# Altium footprint library FMU3_REV_D.PcbLib: 53 footprints (part 2 of 4)
Each footprint in its own frame and in the unit in brackets; x right, y up, seen from the top. Pads: shape width x height; smd on the part's side, far side on the other; paste and mask are expansions set on the pad; w line width, h text height; cw(c..) or ccw(c..) is an arc to the next point about the centre after c.
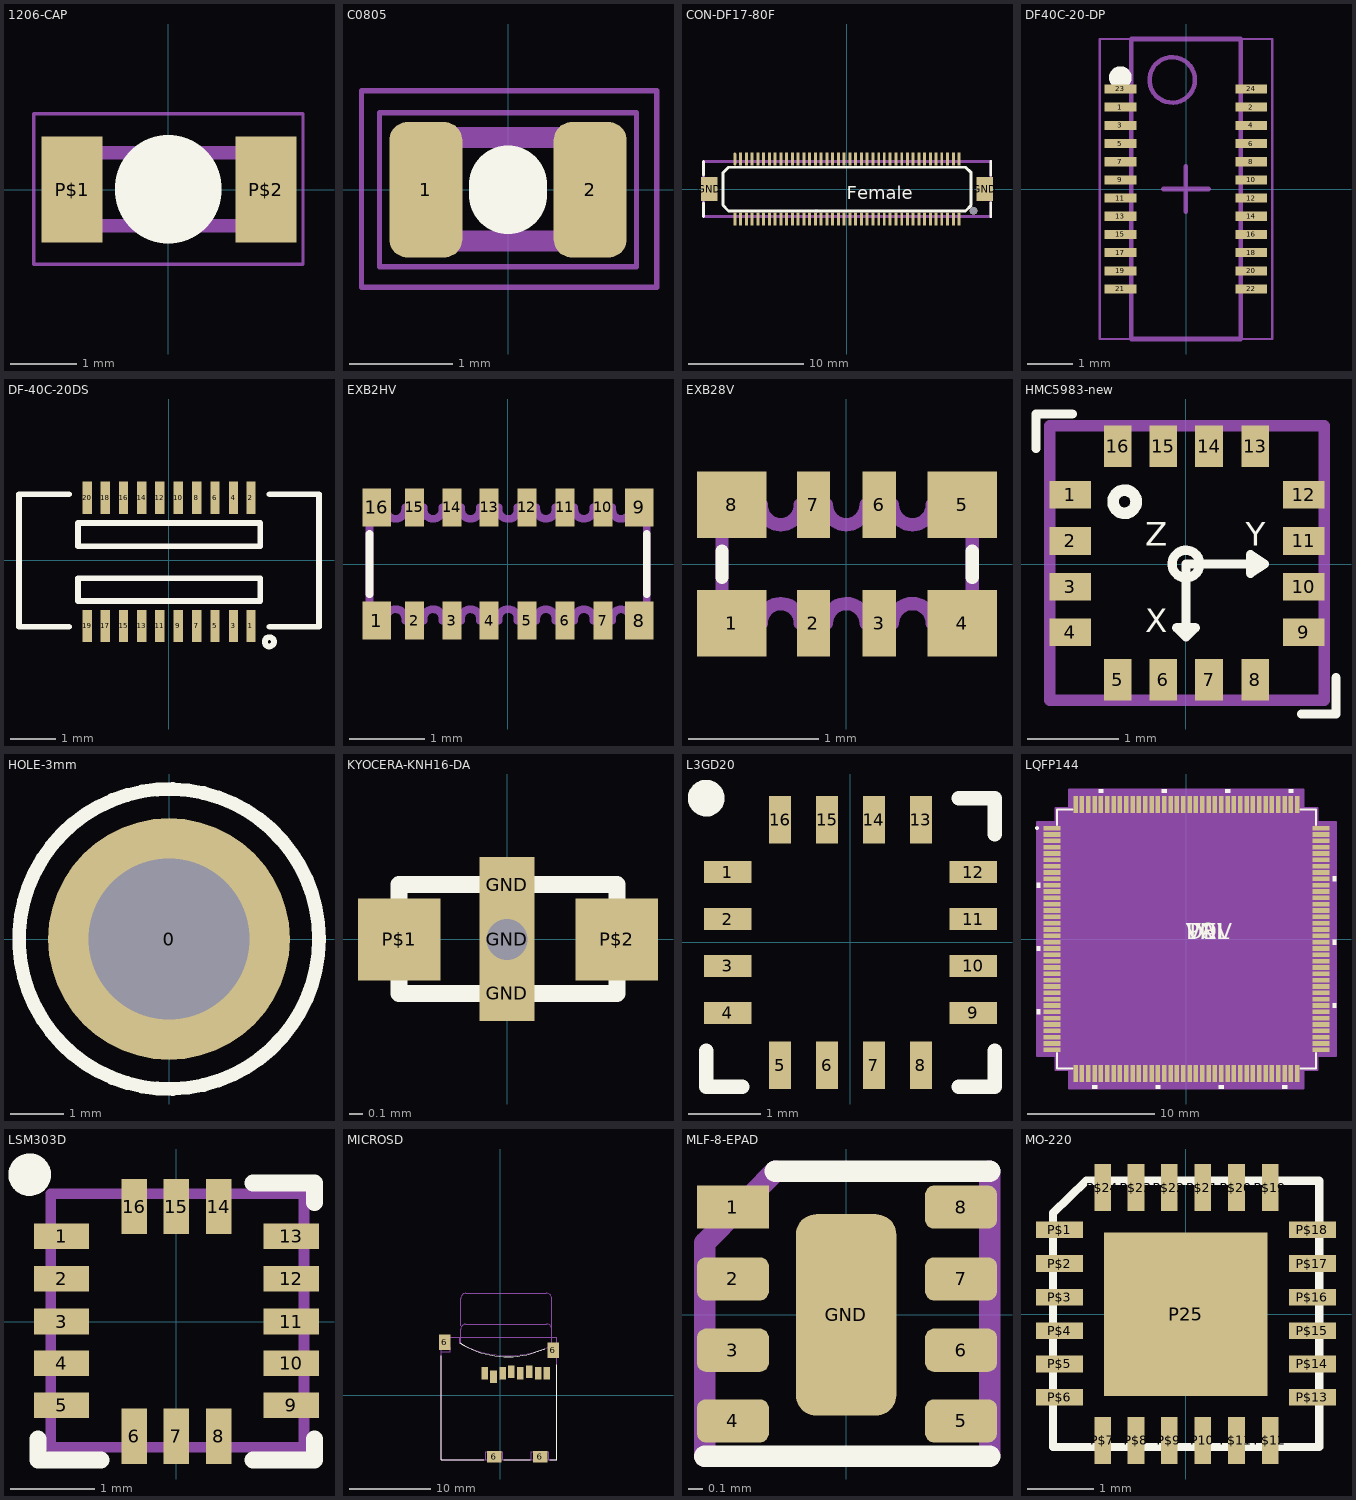
[diagram p1: the footprints below, top view; thin cyan lines are the x and y axes]

## 1206-CAP [mil]
pads (2):
  rect 36x63 smd: P$1(-57.09,0) P$2(58,0)
Top Overlay:
  lines w63: 0,-0.39 0,1
Mechanical 16:
  rectangle: -68.9,-25.59 -45.27,26
  rectangle: 46,-25.59 69,26
  lines w2: -79.72,-44.29 80,-44.29 80,45 -79.72,45 -79.72,-44.29
  lines w8: -45.28,-21.59 46,-21.59 ; -45.28,22 46,22

## C0805 [mil]
height 66.93
pads (2):
  rrect50% 28x52 smd mask+0: 1(-31.5,0) 2(31.5,0)
Top Overlay:
  lines w30: 0,-2 0,2
Mechanical 2:
  lines w1.97: -49.21,-29.53 -49.21,29.53 49.21,29.53 49.21,-29.53 -49.21,-29.53
Mechanical 3:
Mechanical 16:
  rectangle: 23.99,-23.67 39.99,24
  rectangle: -39.37,-23.67 -23.62,24
  lines w2: -56.1,-37.4 -56.1,38 57,38 57,-37.4 -56.1,-37.4
  lines w8: -23.62,-19.68 24,-19.68 ; -23.62,20 24,20
3D body: height 30.79, standoff 0, extent -39.37,-24.61 39.37,24.61

## CON-DF17-80F [mil]
pads (83):
  rrect100% 10x44 smd: 1(-383.86,103)
  rect 10x44 smd: 2(-383.86,-102.36) 3(-364.17,103) 4(-364.17,-102.36) 5(-344.49,103) 6(-344.49,-102.36) 7(-324.8,103) 8(-324.8,-102.36) 9(-305.12,103) 10(-305.12,-102.36) 11(-285.43,103) 12(-285.43,-102.36) 13(-265.75,103) 14(-265.75,-102.36) 15(-246.06,103) 16(-246.06,-102.36) 17(-226.38,103) 18(-226.38,-102.36) 19(-206.69,103) 20(-206.69,-102.36) 21(-187.01,103) 22(-187.01,-102.36) 23(-167.32,103) 24(-167.32,-102.36) 25(-147.64,103) 26(-147.64,-102.36) 27(-127.95,103) 28(-127.95,-102.36) 29(-108.27,103) 30(-108.27,-102.36) 31(-88.58,103) 32(-88.58,-102.36) 33(-68.9,103) 34(-68.9,-102.36) 35(-49.21,103) 36(-49.21,-102.36) 37(-29.53,103) 38(-29.53,-102.36) 39(-9.84,103) 40(-9.84,-102.36) 41(10,103) 42(10,-102.36) 43(30,103) 44(30,-102.36) 45(50,103) 46(50,-102.36) 47(69,103) 48(69,-102.36) 49(89,103) 50(89,-102.36) 51(109,103) 52(109,-102.36) 53(128,103) 54(128,-102.36) 55(148,103) 56(148,-102.36) 57(168,103) 58(168,-102.36) 59(188,103) 60(188,-102.36) 61(207,103) 62(207,-102.36) 63(227,103) 64(227,-102.36) 65(247,103) 66(247,-102.36) 67(266,103) 68(266,-102.36) 69(286,103) 70(286,-102.36) 71(306,103) 72(306,-102.36) 73(325,103) 74(325,-102.36) 75(345,103) 76(345,-102.36) 77(365,103) 78(365,-102.36) 79(384,103) 80(384,-102.36)
  rect 56x83 smd: GND(-472.44,0) GND(473,0)
  round 25.98 hole 26 unplated: hole-2(434,-74.8)
Top Overlay:
  lines w10: -492.13,-94.49 -492.13,-47.24 ; -492.13,48 -492.13,95 ; 493,-94.49 493,-47.24 ; 493,48 493,95 ; -425.2,-55.12 -425.2,56 -405.51,75 406,75 426,56 426,-55.12 406,-74.8 -405.51,-74.8 -425.2,-55.12
  text "Female" at 0,-50 h77.5
Mechanical 16:
  lines w10: -106.3,-74.8 -102.36,-74.8 ; -492.13,-94.49 493,-94.49 493,95 -492.13,95 -492.13,-94.49
3D body: height 118.11, standoff -23.62, extent -491.85,-112.2 492.4,112.21

## DF40C-20-DP [mm]
height 2
pads (24):
  rect 0.7x0.2 smd mask+0: 1(-1.444,1.8) 2(1.436,1.8) 3(-1.444,1.4) 4(1.436,1.4) 5(-1.444,1) 6(1.436,1) 7(-1.444,0.6) 8(1.436,0.6) 9(-1.444,0.2) 10(1.436,0.2) 11(-1.444,-0.2) 12(1.436,-0.2) 13(-1.444,-0.6) 14(1.436,-0.6) 15(-1.444,-1) 16(1.436,-1) 17(-1.444,-1.4) 18(1.436,-1.4) 19(-1.444,-1.8) 20(1.436,-1.8) 21(-1.444,-2.2) 22(1.436,-2.2) 23(-1.444,2.2) 24(1.436,2.2)
Top Overlay:
  circle w0.25: c-1.444,2.45 r0.125
Mechanical 13:
  circle w0.1: c-0.304,2.4 r0.5
  lines w0.1: -1.2,3.3 -1.2,3.3 ; -1.2,3.3 1.2,3.3 ; -1.2,3.3 -1.2,-3.3 1.2,-3.3 1.2,3.3 ; 1.2,3.3 1.2,3.3
Mechanical 15:
  lines w0.05: -1.9,-3.3 1.9,-3.3 1.9,3.3 -1.9,3.3 -1.9,-3.3
  lines w0.1: -0.504,0 0.496,0 ; -0.004,-0.5 -0.004,0.5
3D body: height 1.09, standoff -0.05, extent -1.47,-2.76 1.5,2.76

## DF-40C-20DS [mil] "DF-40C-20DS"
pads (20):
  rect 8x28 smd: 1(71,-57.09) 2(71,54) 3(56,-57.09) 4(56,54) 5(40,-57.09) 6(40,54) 7(24,-57.09) 8(24,54) 9(8,-57.09) 10(8,54) 11(-7.87,-57.09) 12(-7.87,54) 13(-23.62,-57.09) 14(-23.62,54) 15(-39.37,-57.09) 16(-39.37,54) 17(-55.12,-57.09) 18(-55.12,54) 19(-70.87,-57.09) 20(-70.87,54)
Top Overlay:
  circle w5: c87,-70.87 r4
  lines w5: -86.61,-57.87 -129.92,-57.87 -129.92,57 -86.61,57 ; 87,-57.87 130,-57.87 130,57 87,57 ; -78.74,-35.43 -78.74,-15.75 79,-15.75 79,-35.43 -78.74,-35.43 ; -78.74,12 79,12 79,32 -78.74,32 -78.74,12
3D body: height 55.12, standoff -1.97, extent -129.92,-68.07 129.92,65

## EXB2HV [mil] "EXB2HV"
pads (16):
  rect 15x20 smd: 1(-68.9,-29.53) 8(69,-29.53) 9(69,30) 16(-68.9,30)
  rect 10x20 smd: 2(-49.21,-29.53) 3(-29.53,-29.53) 4(-9.84,-29.53) 5(10,-29.53) 6(30,-29.53) 7(50,-29.53) 10(50,30) 11(30,30) 12(10,30) 13(-9.84,30) 14(-29.53,30) 15(-49.21,30)
Top Overlay:
  lines w4: -72.83,-15.75 -72.83,16 ; 73,-15.75 73,16
Mechanical 16:
  lines w4: -72.83,-29.53 -72.83,30 -63.98,30 -63.98,29 ccw(c-59.11,28.86) -59.25,24 -58.86,24 ccw(c-59,28.86) -54.13,29 -54.13,30 -44.29,30 -44.29,29 ccw(c-39.43,28.86) -39.57,24 -39.17,24 ccw(c-39.31,28.86) -34.45,29 -34.45,30 -24.61,30 -24.61,29 ccw(c-19.74,28.86) -19.88,24 -19.49,24 ccw(c-19.63,28.86) -14.76,29 -14.76,30 -4.92,30 -4.92,29 ccw(c-0.06,28.86) -0.2,24 1,24 ccw(c0.5,28.5) 5,29 5,30 15,30 15,29 ccw(c20,29) 20,24 ccw(c20,29) 25,29 25,30 35,30 35,29 ccw(c40,29) 40,24 ccw(c40,29) 45,29 45,30 55,30 55,29 ccw(c59.5,28.5) 59,24 60,24 ccw(c59.5,28.5) 64,29 64,30 73,30 73,-29.53 64,-29.53 64,-28.35 ccw(c59.64,-27.98) 60,-23.62 59,-23.62 ccw(c59.36,-27.98) 55,-28.35 55,-29.53 45,-29.53 45,-28.35 ccw(c40.14,-28.48) 40,-23.62 ccw(c39.86,-28.48) 35,-28.35 35,-29.53 25,-29.53 25,-28.35 ccw(c20.14,-28.48) 20,-23.62 ccw(c19.86,-28.48) 15,-28.35 15,-29.53 5,-29.53 5,-28.35 ccw(c0.64,-27.98) 1,-23.62 -0.2,-23.62 ccw(c-0.2,-28.35) -4.92,-28.35 -4.92,-29.53 -14.76,-29.53 -14.76,-28.35 ccw(c-19.49,-28.35) -19.49,-23.62 -19.88,-23.62 ccw(c-19.88,-28.35) -24.61,-28.35 -24.61,-29.53 -34.45,-29.53 -34.45,-28.35 ccw(c-39.17,-28.35) -39.17,-23.62 -39.57,-23.62 ccw(c-39.57,-28.35) -44.29,-28.35 -44.29,-29.53 -54.13,-29.53 -54.13,-28.35 ccw(c-58.86,-28.35) -58.86,-23.62 -59.25,-23.62 ccw(c-59.25,-28.35) -63.98,-28.35 -63.98,-29.53 -72.83,-29.53
3D body: height 19.84, standoff -0.16, extent -60.1,-20 -40,20
3D body: height 19.84, standoff -0.16, extent 59.95,-20 80.05,20
3D body: height 19.84, standoff -0.16, extent 39.9,-20 60,20
3D body: height 19.84, standoff -0.16, extent 19.9,-20 40,20
3D body: height 19.84, standoff -0.16, extent -0.1,-20 20,20
3D body: height 19.84, standoff -0.16, extent -20.1,-20 0,20
3D body: height 19.84, standoff -0.16, extent -40.1,-20 -20,20
3D body: height 19.84, standoff -0.16, extent -80.1,-20 -60,20

## EXB28V [mil] "EXB28V"
pads (8):
  rect 21x20 smd: 1(-34.45,-17.72) 4(35,-17.72) 5(35,18) 8(-34.45,18)
  rect 10x20 smd: 2(-9.84,-17.72) 3(10,-17.72) 6(10,18) 7(-9.84,18)
Top Overlay:
  lines w4: -37.4,-3.94 -37.4,4 ; 38,-3.94 38,4
Mechanical 16:
  lines w4: -37.4,-17.72 -37.4,18 -25.59,18 ccw(c-19.64,17.95) -19.69,12 ccw(c-19.73,17.95) -13.78,18 -5.91,18 ccw(c0.05,17.95) 0,12 ccw(c0,18) 6,18 14,18 ccw(c20,18) 20,12 ccw(c20,18) 26,18 38,18 38,-17.72 26,-17.72 ccw(c20.05,-17.76) 20,-11.81 ccw(c19.95,-17.76) 14,-17.72 6,-17.72 ccw(c0.05,-17.76) 0,-11.81 ccw(c0,-17.72) -5.91,-17.72 -13.78,-17.72 ccw(c-19.68,-17.72) -19.68,-11.81 ccw(c-19.68,-17.72) -25.59,-17.72 -37.4,-17.72
3D body: height 20.1, standoff 0, extent -40,-20 -20,20
3D body: height 20.1, standoff 0, extent -20,-20 0,20
3D body: height 20.1, standoff 0, extent 20,-20 40,20
3D body: height 20.1, standoff 0, extent 0,-20 20,20

## HMC5983-new [mil] "HMC5983"
pads (16):
  rect 18x12 smd: 1(-50.2,30) 2(-50.2,10) 3(-50.2,-9.84) 4(-50.2,-29.53) 9(51,-29.53) 10(51,-9.84) 11(51,10) 12(51,30)
  rect 12x18 smd: 5(-29.53,-50.2) 6(-9.84,-50.2) 7(10,-50.2) 8(30,-50.2) 13(30,51) 14(10,51) 15(-9.84,51) 16(-29.53,51)
Top Overlay:
  circle w5: c-26.57,27 r5
  circle w4: c0,0 r6
  lines w4: -64.96,50 -64.96,65 -49.21,65 ; 50,-64.96 65,-64.96 65,-49.21 ; 0,-31.5 0,0 34,0 ; 0,-31.5 4,-27.56 -3.94,-27.56 0,-31.5 ; 34,0 28,4 28,-3.94 34,0
  text "X" at -17.72,-29.53 h10.2
  text "Y" at 26,8 h10.2
  text "Z" at -17.72,8 h10.2
Mechanical 16:
  lines w5: -59.06,-59.06 60,-59.06 ; -59.06,-59.06 -59.06,60 ; -59.06,-59.06 60,-59.06 ; -59.06,-59.06 -59.06,60 ; -59.06,60 60,60 ; -59.06,60 60,60 ; 60,-59.06 60,60 ; 60,-59.06 60,60
3D body: height 35.43, standoff 0, extent -59,-58.88 60.77,60.88

## HOLE-3mm [mm] "Surface mount thread"
height 2
pads (1):
  round 4.5 hole 3: 0(0,0)
Top Overlay:
  circle w0.254: c0,0 r2.794
Top Paste:
  lines w1: -1.414,-0.707 ccw(c0,0) -0.707,-1.414 ; -1.414,0.707 cw(c0,0) -0.707,1.414 ; 0.707,-1.414 ccw(c0,0) 1.414,-0.707 ; 0.707,1.414 cw(c0,0) 1.414,0.707
Top Solder:
  lines w1: -1.414,-0.707 ccw(c0,0) -0.707,-1.414 ; -1.414,0.707 cw(c0,0) -0.707,1.414 ; 0.707,-1.414 ccw(c0,0) 1.414,-0.707 ; 0.707,1.414 cw(c0,0) 1.414,0.707
3D body: height 2, standoff -0.48, extent -1.651,-1.83 1.529,1.83

## KYOCERA-KNH16-DA [mil] "KYOCERA-KNH16-DA"
pads (5):
  rect 16x16 smd: GND(0,-15.75) GND(0,16)
  rect 16x16 hole 12: GND(0,0)
  rect 24x24 smd: P$1(-31.5,0) P$2(32,0)
Top Overlay:
  lines w5: -31.5,-15.75 32,-15.75 32,16 -31.5,16 -31.5,-15.75
3D body: height 13.78, standoff 0, extent -19.69,-9.84 19.69,9.84

## L3GD20 [mil] "4x4x1"
pads (16):
  rect 26x12 smd mask+0: 1(-66.93,38.39) 2(-66.93,12.8) 3(-66.93,-12.8) 4(-66.93,-38.39) 9(66.93,-38.39) 10(66.93,-12.8) 11(66.93,12.8) 12(66.93,38.39)
  rect 12x26 smd mask+0: 5(-38.39,-66.93) 6(-12.8,-66.93) 7(12.8,-66.93) 8(38.39,-66.93) 13(38.39,66.93) 14(12.8,66.93) 15(-12.8,66.93) 16(-38.39,66.93)
Top Overlay:
  circle w10: c-78.74,78.74 r5
  lines w8: -78.74,-59.06 -78.74,-78.74 -59.06,-78.74 ; 59.06,-78.74 78.74,-78.74 78.74,-59.06 ; 59.06,78.74 78.74,78.74 78.74,59.06
3D body: height 38.78, standoff 0, extent -78.74,-78.74 78.74,78.74

## LQFP144 [mil] "check VDD&VSS pins"
pads (144):
  rect 53x14 smd: 1(-418.31,344.49) 2(-418.31,324.8) 3(-418.31,305.12) 4(-418.31,285.43) 5(-418.31,265.75) 6(-418.31,246.06) 7(-418.31,226.38) 8(-418.31,206.69) 9(-418.31,187.01) 10(-418.31,167.32) 11(-418.31,147.64) 12(-418.31,127.95) 13(-418.31,108.27) 14(-418.31,88.58) 15(-418.31,68.9) 18(-418.31,9.84) 19(-418.31,-9.84) 20(-418.31,-29.53) 21(-418.31,-49.21) 22(-418.31,-68.9) 23(-418.31,-88.58) 24(-418.31,-108.27) 25(-418.31,-127.95) 26(-418.31,-147.64) 27(-418.31,-167.32) 28(-418.31,-187.01) 29(-418.31,-206.69) 31(-418.31,-246.06) 32(-418.31,-265.75) 33(-418.31,-285.43) 34(-418.31,-305.12) 35(-418.31,-324.8) 36(-418.31,-344.49) 73(418.31,-344.49) 74(418.31,-324.8) 75(418.31,-305.12) 76(418.31,-285.43) 77(418.31,-265.75) 78(418.31,-246.06) 79(418.31,-226.38) 80(418.31,-206.69) 81(418.31,-187.01) 82(418.31,-167.32) 85(418.31,-108.27) 86(418.31,-88.58) 87(418.31,-68.9) 88(418.31,-49.21) 89(418.31,-29.53) 90(418.31,-9.84) 91(418.31,9.84) 92(418.31,29.53) 93(418.31,49.21) 96(418.31,108.27) 97(418.31,127.95) 98(418.31,147.64) 99(418.31,167.32) 100(418.31,187.01) 101(418.31,206.69) 102(418.31,226.38) 103(418.31,246.06) 104(418.31,265.75) 105(418.31,285.43) 106(418.31,305.12) VDD(-418.31,-226.38) VDD(-418.31,29.53) VDD(418.31,-127.95) VDD(418.31,88.58) VDD(418.31,344.49) VSS(-418.31,49.21) VSS(418.31,-147.64) VSS(418.31,68.9) VSS(418.31,324.8)
  rect 14x53 smd: 37(-344.49,-418.31) 40(-285.43,-418.31) 41(-265.75,-418.31) 42(-246.06,-418.31) 43(-226.38,-418.31) 44(-206.69,-418.31) 45(-187.01,-418.31) 46(-167.32,-418.31) 47(-147.64,-418.31) 48(-127.95,-418.31) 49(-108.27,-418.31) 50(-88.58,-418.31) 53(-29.53,-418.31) 54(-9.84,-418.31) 55(9.84,-418.31) 56(29.53,-418.31) 57(49.21,-418.31) 58(68.9,-418.31) 59(88.58,-418.31) 60(108.27,-418.31) 63(167.32,-418.31) 64(187.01,-418.31) 65(206.69,-418.31) 66(226.38,-418.31) 67(246.06,-418.31) 68(265.75,-418.31) 69(285.43,-418.31) 70(305.12,-418.31) 71(324.8,-418.31) 109(344.49,418.31) 110(324.8,418.31) 111(305.12,418.31) 112(285.43,418.31) 113(265.75,418.31) 114(246.06,418.31) 115(226.38,418.31) 116(206.69,418.31) 117(187.01,418.31) 118(167.32,418.31) 119(147.64,418.31) 122(88.58,418.31) 123(68.9,418.31) 124(49.21,418.31) 125(29.53,418.31) 126(9.84,418.31) 127(-9.84,418.31) 128(-29.53,418.31) 129(-49.21,418.31) 132(-108.27,418.31) 133(-127.95,418.31) 134(-147.64,418.31) 135(-167.32,418.31) 136(-187.01,418.31) 137(-206.69,418.31) 138(-226.38,418.31) 139(-246.06,418.31) 140(-265.75,418.31) 141(-285.43,418.31) 142(-305.12,418.31) 143(-324.8,418.31) VDD(-344.49,418.31) VDD(-305.12,-418.31) VDD(-88.58,418.31) VDD(-49.21,-418.31) VDD(108.27,418.31) VDD(147.64,-418.31) VDD(344.49,-418.31) VSS(-324.8,-418.31) VSS(-68.9,-418.31) VSS(-68.9,418.31) VSS(127.95,-418.31) VSS(127.95,418.31)
Top Overlay:
  circle w6: c-464.65,344.49 r3
  region: -454.81,174.82 -464.81,174.82 -464.81,159.82 -454.81,159.82
  region: -454.81,-22.03 -464.81,-22.03 -464.81,-37.03 -454.81,-37.03
  region: -454.81,-218.88 -464.81,-218.88 -464.81,-233.88 -454.81,-233.88
  region: -277.93,-454.81 -292.93,-454.81 -292.93,-464.81 -277.93,-464.81
  region: -81.08,-454.81 -96.08,-454.81 -96.08,-464.81 -81.08,-464.81
  region: 115.77,-454.81 100.77,-454.81 100.77,-464.81 115.77,-464.81
  region: 312.62,-454.81 297.62,-454.81 297.62,-464.81 312.62,-464.81
  region: 454.81,-199.19 464.81,-199.19 464.81,-214.19 454.81,-214.19
  region: 454.81,-2.34 464.81,-2.34 464.81,-17.34 454.81,-17.34
  region: 454.81,194.51 464.81,194.51 464.81,179.51 454.81,179.51
  region: 332.3,454.81 317.3,454.81 317.3,464.81 332.3,464.81
  region: 135.45,454.81 120.45,454.81 120.45,464.81 135.45,464.81
  region: -61.4,454.81 -76.4,454.81 -76.4,464.81 -61.4,464.81
  region: -258.25,454.81 -273.25,454.81 -273.25,464.81 -258.25,464.81
  lines w6: -402.5,-354.49 -402.5,-402.5 -354.49,-402.5 ; -402.5,354.49 -402.5,402.5 -354.49,402.5 ; 354.49,-402.5 402.5,-402.5 402.5,-354.49 ; 354.49,402.5 402.5,402.5 402.5,354.49
  text "PN" at 0,0 h50
  text "DEV" at 0,0 h50
  text "VAL" at 0,0 h50
  text "TOL" at 0,0 h50
Mechanical 13:
  circle w0: c-366.81,344.49 r3
  text "RefDes2" at 0,0 h50
Mechanical 15:
  region: -364.49,-407.5 -407.5,-407.5 -407.5,-364.49 -464.81,-364.49 -464.81,364.49 -407.5,364.49 -407.5,407.5 -364.49,407.5 -364.49,464.81 364.49,464.81 364.49,407.5 407.5,407.5 407.5,364.49 464.81,364.49 464.81,-364.49 407.5,-364.49 407.5,-407.5 364.49,-407.5 364.49,-464.81 -364.49,-464.81
  lines w6: -464.81,-364.49 -407.5,-364.49 -407.5,-407.5 -364.49,-407.5 -364.49,-464.81 364.49,-464.81 364.49,-407.5 407.5,-407.5 407.5,-364.49 464.81,-364.49 464.81,364.49 407.5,364.49 407.5,407.5 364.49,407.5 364.49,464.81 -364.49,464.81 -364.49,407.5 -407.5,407.5 -407.5,364.49 -464.81,364.49 -464.81,-364.49
Multi-Layer:
  text "Copyright (C) 2016 Accelerated Designs. All rights reserved" at 0,0 h1
3D body: height 63.1, standoff 0, extent -431.03,-427.05 431.03,435

## LSM303D [mil] "LGA-16L"
pads (16):
  rect 26x12 smd mask+0: 1(-53.94,40) 2(-53.94,20) 3(-53.94,0) 4(-53.94,-19.69) 5(-53.94,-39.37) 9(54,-39.37) 10(54,-19.69) 11(54,0) 12(54,20) 13(54,40)
  rect 12x26 smd mask+0: 6(-19.68,-53.94) 7(0,-53.94) 8(20,-53.94) 14(20,54) 15(0,54) 16(-19.68,54)
Top Overlay:
  circle w10: c-68.9,69 r5
  lines w8: -64.96,-55.12 -64.96,-64.96 -35.43,-64.96 ; 36,-64.96 65,-64.96 65,-55.12 ; 36,65 65,65 65,56
Mechanical 16:
  lines w5: -59.06,-59.06 60,-59.06 60,60 -59.06,60 -59.06,-59.06
3D body: height -16.54, standoff -56.69, extent -59.06,-59.06 59.06,59.06

## MICROSD [mil] "MICROSD"
pads (12):
  rect 32x60 smd: 1(-76.38,107) 2(-33.07,91) 3(11,107) 4(54,115) 5(97,107) 6(141,115) 7(184,107) 8(227,107)
  rect 56x75 smd: 6(-269.69,258) 6(258,219)
  rect 71x56 smd: 6(-29.53,-299.21) 6(195,-299.21)
Top Overlay:
  lines w5: -287.4,193 -287.4,-314.96 -80.71,-314.96 ; -196.85,256 ccw(c35.12,618.63) 216,228 ; 17,-314.96 145,-314.96 ; 242,-314.96 276,-314.96 276,150
Mechanical 16:
  lines w0: -192.91,252 -192.91,322 cw(c-167.81,321.9) -167.7,347 225,347 cw(c224.5,319.5) 252,319 252,249 ; -192.91,339 -192.91,471 cw(c-167.31,471.4) -167.7,497 225,497 cw(c224.5,469.5) 252,469 252,331
  lines w4: -287.4,-314.96 -287.4,284 276,284 276,-314.96 -287.4,-314.96
  lines w5: -287.4,-314.96 -70.87,-314.96 -70.87,-275.59 -59.06,-275.59 -59.06,-314.96 -3.94,-314.96 -3.94,-275.59 12,-275.59 12,-314.96 150,-314.96 150,-275.59 162,-275.59 162,-314.96 221,-314.96 221,-275.59 237,-275.59 237,-314.96 276,-314.96 276,249 256,249 252,245 cw(c37.61,660) -196.85,256 -196.85,284 -287.4,284 -287.4,233 -244.09,233 -244.09,213 -287.4,213 -287.4,-314.96
Mechanical 30:
  text "card OUT" at -51.18,457 h49.6
  text "card IN" at -27.56,308 h49.6
3D body: height 72.83, standoff -1.97, extent -275.59,-315.2 275.59,285.2

## MLF-8-EPAD [mil] "MLF-8-EPAD"
pads (9):
  rect 20x12 smd: 1(-31.5,30)
  rrect40% 20x12 smd: 2(-31.5,10) 3(-31.5,-9.84) 4(-31.5,-29.53) 5(32,-29.53) 6(32,-9.84) 7(32,10) 8(32,30)
  rrect40% 28x56 smd: GND(0,0)
Top Overlay:
  lines w6: -39.37,-39.37 40,-39.37 ; -19.68,40 40,40
  text "." at -35,50 h20.47
Mechanical 16:
  lines w6: -39.37,-39.37 -39.37,20 -19.68,40 ; 40,-39.37 40,40
3D body: height 33.46, standoff 0, extent -39.76,-39.37 39.76,39.37

## MO-220 [mil] "MO-220"
pads (25):
  rect 10x28 smd: P10(10,-74.8) P$7(-49.21,-74.8) P$8(-29.53,-74.8) P$9(-9.84,-74.8) P$11(30,-74.8) P$12(50,-74.8) P$19(50,75) P$20(30,75) P$21(10,75) P$22(-9.84,75) P$23(-29.53,75) P$24(-49.21,75)
  rect 97x97 smd paste-11.81: P25(0,0)
  rect 28x10 smd: P$1(-74.8,50) P$2(-74.8,30) P$3(-74.8,10) P$4(-74.8,-9.84) P$5(-74.8,-29.53) P$6(-74.8,-49.21) P$13(75,-49.21) P$14(75,-29.53) P$15(75,-9.84) P$16(75,10) P$17(75,30) P$18(75,50)
Top Overlay:
  lines w5: -78.74,-78.74 79,-78.74 79,79 -59.06,79 -78.74,60 -78.74,-78.74
Top Paste:
  rectangle: -19.68,-19.68 20,20
3D body: height 35.43, standoff 0, extent -78.82,-78.82 78.82,78.82